# Altium footprint library CMR_ICs.PcbLib: 68 footprints (part 2 of 5)
Each footprint in its own frame and in the unit in brackets; x right, y up, seen from the top. Pads: shape width x height; smd on the part's side, far side on the other; paste and mask are expansions set on the pad; w line width, h text height; cw(c..) or ccw(c..) is an arc to the next point about the centre after c.
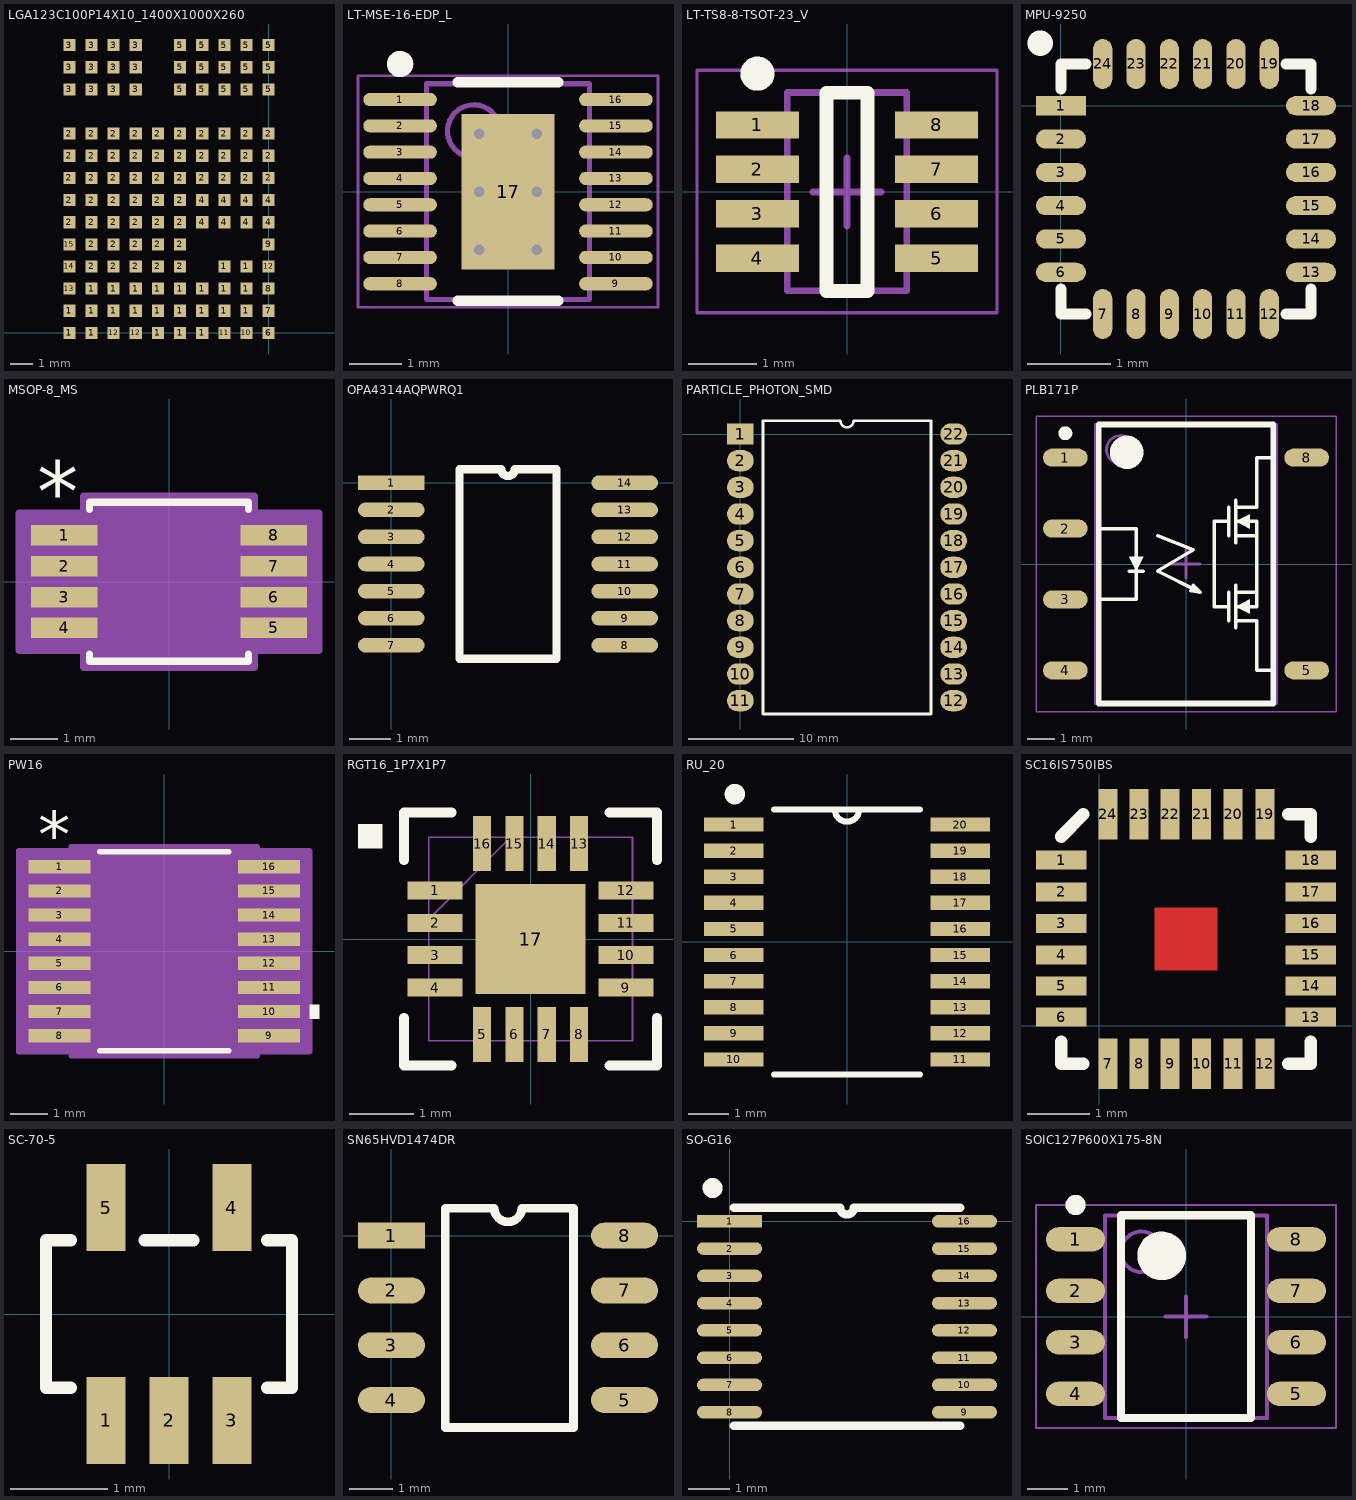
[diagram p1: the footprints below, top view; thin cyan lines are the x and y axes]

## LGA123C100P14X10_1400X1000X260 [mm] "LGA, 123-Leads, Body 14.00x10.00mmx2.60mm, Pitch 1.00mm"
height 2.6
pads (123):
  rect 0.55x0.55 smd: 1(-9,0) 1(-9,1) 1(-8,0) 1(-8,1) 1(-8,2) 1(-7,1) 1(-7,2) 1(-6,1) 1(-6,2) 1(-5,0) 1(-5,1) 1(-5,2) 1(-4,0) 1(-4,1) 1(-4,2) 1(-3,0) 1(-3,1) 1(-3,2) 1(-2,1) 1(-2,2) 1(-2,3) 1(-1,1) 1(-1,2) 1(-1,3) 2(-9,5) 2(-9,6) 2(-9,7) 2(-9,8) 2(-9,9) 2(-8,3) 2(-8,4) 2(-8,5) 2(-8,6) 2(-8,7) 2(-8,8) 2(-8,9) 2(-7,3) 2(-7,4) 2(-7,5) 2(-7,6) 2(-7,7) 2(-7,8) 2(-7,9) 2(-6,3) 2(-6,4) 2(-6,5) 2(-6,6) 2(-6,7) 2(-6,8) 2(-6,9) 2(-5,3) 2(-5,4) 2(-5,5) 2(-5,6) 2(-5,7) 2(-5,8) 2(-5,9) 2(-4,3) 2(-4,4) 2(-4,5) 2(-4,6) 2(-4,7) 2(-4,8) 2(-4,9) 2(-3,7) 2(-3,8) 2(-3,9) 2(-2,7) 2(-2,8) 2(-2,9) 2(-1,7) 2(-1,8) 2(-1,9) 2(0,7) 2(0,8) 2(0,9) 3(-9,11) 3(-9,12) 3(-9,13) 3(-8,11) 3(-8,12) 3(-8,13) 3(-7,11) 3(-7,12) 3(-7,13) 3(-6,11) 3(-6,12) 3(-6,13) 4(-3,5) 4(-3,6) 4(-2,5) 4(-2,6) 4(-1,5) 4(-1,6) 4(0,5) 4(0,6) 5(-4,11) 5(-4,12) 5(-4,13) 5(-3,11) 5(-3,12) 5(-3,13) 5(-2,11) 5(-2,12) 5(-2,13) 5(-1,11) 5(-1,12) 5(-1,13) 5(0,11) 5(0,12) 5(0,13) 6(0,0) 7(0,1) 8(0,2) 9(0,4) 10(-1,0) 11(-2,0) 12(-7,0) 12(-6,0) 12(0,3) 13(-9,2) 14(-9,3) 15(-9,4)
3D body: height 2.6, standoff 0.3, extent -9.5,-0.5 0.5,13.5

## LT-MSE-16-EDP_L [mm] "SOP, 16-Leads, Body 4.1x3.1mm, Pitch 0.5mm, Thermal Pad 2.95x1.76mm, IPC High Density"
height 1.1
pads (17):
  oval 1.4x0.25 smd: 1(-2.05,1.75) 2(-2.05,1.25) 3(-2.05,0.75) 4(-2.05,0.25) 5(-2.05,-0.25) 6(-2.05,-0.75) 7(-2.05,-1.25) 8(-2.05,-1.75) 9(2.05,-1.75) 10(2.05,-1.25) 11(2.05,-0.75) 12(2.05,-0.25) 13(2.05,0.25) 14(2.05,0.75) 15(2.05,1.25) 16(2.05,1.75)
  rect 1.76x2.95 smd: 17(0,0)
via -0.55,1.1 diameter 0.5 hole 0.2
via 0.55,1.1 diameter 0.5 hole 0.2
via -0.55,0 diameter 0.5 hole 0.2
via 0.55,0 diameter 0.5 hole 0.2
via -0.55,-1.1 diameter 0.5 hole 0.2
via 0.55,-1.1 diameter 0.5 hole 0.2
Top Overlay:
  circle w0.25: c-2.05,2.425 r0.125
  lines w0.2: -0.951,-2.075 0.951,-2.075 ; -0.951,2.075 0.951,2.075
Mechanical 13:
  circle w0.1: c-0.65,1.15 r0.5
  lines w0.1: -1.55,-2.05 -1.55,2.05 1.55,2.05 1.55,-2.05 -1.55,-2.05
Mechanical 15:
  lines w0.05: -2.85,-2.2 -2.85,2.2 2.85,2.2 2.85,-2.2 -2.85,-2.2
  lines w0.1: -0.5,0 0.5,0 ; 0,-0.5 0,0.5
3D body: height 1.1, standoff 0.05, extent -1.55,-2.05 1.55,2.05

## LT-TS8-8-TSOT-23_V [mm] "SOT23, 8-Leads, Body 2.90x1.63mm, Pitch 0.65mm, Recommended"
height 1
pads (8):
  rect 1.22x0.4 smd: 1(-1.31,0.975) 2(-1.31,0.325) 3(-1.31,-0.325) 4(-1.31,-0.975) 5(1.31,-0.975) 6(1.31,-0.325) 7(1.31,0.325) 8(1.31,0.975)
Top Overlay:
  circle w0.25: c-1.31,1.726 r0.125
  lines w0.2: -0.3,-1.454 -0.3,1.446 0.3,1.446 0.3,-1.454 -0.3,-1.454
Mechanical 13:
  lines w0.1: -0.875,-1.45 0.875,-1.45 0.875,1.45 -0.875,1.45 -0.875,-1.45
Mechanical 15:
  lines w0.05: -2.195,-1.775 -1.75,-1.775 1.75,-1.775 2.195,-1.775 2.195,-1.55 2.195,1.55 2.195,1.775 1.75,1.775 -1.75,1.775 -2.195,1.775 -2.195,1.55 -2.195,-1.55 -2.195,-1.775
  lines w0.1: -0.501,-0.004 0.499,-0.004 ; -0.001,-0.504 -0.001,0.496
3D body: height 1, standoff 0.01, extent -0.875,-1.45 0.875,1.45

## MPU-9250 [mm] "InvenSense MPU-9250 9-axis IMU"
height 1
pads (24):
  rect 0.6x0.23 smd: 1(0,0)
  rrect100% 0.6x0.23 smd: 2(0,-0.4) 3(0,-0.8) 4(0,-1.2) 5(0,-1.6) 6(0,-2) 13(3,-2) 14(3,-1.6) 15(3,-1.2) 16(3,-0.8) 17(3,-0.4) 18(3,0)
  rrect100% 0.23x0.6 smd: 7(0.5,-2.5) 8(0.9,-2.5) 9(1.3,-2.5) 10(1.7,-2.5) 11(2.1,-2.5) 12(2.5,-2.5) 19(2.5,0.5) 20(2.1,0.5) 21(1.7,0.5) 22(1.3,0.5) 23(0.9,0.5) 24(0.5,0.5)
Top Overlay:
  circle w0.254: c-0.25,0.75 r0.025
  lines w0.127: 0,-2.2 0,-2.5 0.3,-2.5 ; 0,0.2 0,0.5 0.3,0.5 ; 2.7,-2.5 3,-2.5 3,-2.2 ; 2.7,0.5 3,0.5 3,0.2
3D body: height 1, standoff 0, extent 0,-2.5 3,0.5

## MSOP-8_MS [mil]
pads (8):
  rect 55x17 smd paste+0 mask+0: 1(-87,38.39) 2(-87,12.8) 3(-87,-12.8) 4(-87,-38.39) 5(87,-38.39) 6(87,-12.8) 7(87,12.8) 8(87,38.39)
Top Overlay:
  lines w6: -66,-59.99 -66,-66 66,-66 66,-59.99 ; -66,59.99 -66,66 66,66 66,59.99
  text "*" at -109.5,50.39 h50
Mechanical 13:
  lines w0: -12,61 ccw(c0,61) 12,61
  lines w1: -100.5,-45.89 -61,-45.89 -61,-30.89 -100.5,-30.89 -100.5,-45.89 ; -100.5,-20.3 -61,-20.3 -61,-5.3 -100.5,-5.3 -100.5,-20.3 ; -100.5,5.3 -61,5.3 -61,20.3 -100.5,20.3 -100.5,5.3 ; -100.5,30.89 -61,30.89 -61,45.89 -100.5,45.89 -100.5,30.89 ; -61,-61 -61,61 61,61 61,-61 -61,-61 ; 61,-45.89 100.5,-45.89 100.5,-30.89 61,-30.89 61,-45.89 ; 61,-20.3 100.5,-20.3 100.5,-5.3 61,-5.3 61,-20.3 ; 61,5.3 100.5,5.3 100.5,20.3 61,20.3 61,5.3 ; 61,30.89 100.5,30.89 100.5,45.89 61,45.89 61,30.89
  text "*" at -58.5,8 h50
Mechanical 15:
  region: -71,-56.89 -124.5,-56.89 -124.5,56.89 -71,56.89 -71,71 71,71 71,56.89 124.5,56.89 124.5,-56.89 71,-56.89 71,-71 -71,-71
  lines w6: -124.5,-56.89 -71,-56.89 -71,-71 71,-71 71,-56.89 124.5,-56.89 124.5,56.89 71,56.89 71,71 -71,71 -71,56.89 -124.5,56.89 -124.5,-56.89
3D body: height 10, standoff 0, extent 0,0 10,10
3D body "MSOP-8_MS.stp": height 43.11, standoff 0, extent -100.51,-60.98 100.52,60.99
3D body: height 10, standoff 0, extent -157.5,45 -157.5,45

## OPA4314AQPWRQ1 [mm]
pads (14):
  rect 1.6x0.35 smd: 1(0,0)
  oval 1.6x0.35 smd: 2(0,-0.65) 3(0,-1.3) 4(0,-1.95) 5(0,-2.6) 6(0,-3.25) 7(0,-3.9) 8(5.6,-3.9) 9(5.6,-3.25) 10(5.6,-2.6) 11(5.6,-1.95) 12(5.6,-1.3) 13(5.6,-0.65) 14(5.6,0)
Top Overlay:
  lines w0.2: 1.635,-4.225 1.635,0.325 2.638,0.325 ccw(c2.8,0.325) 2.962,0.325 3.965,0.325 3.965,-4.225 1.635,-4.225
3D body: height 1.2, standoff 0, extent 1.27,-4.255 4.318,0.254

## PARTICLE_PHOTON_SMD [mil]
pads (22):
  rect 100x80 smd: 1(0,0)
  oval 100x80 smd: 2(0,-100) 3(0,-200) 4(0,-300) 5(0,-400) 6(0,-500) 7(0,-600) 8(0,-700) 9(0,-800) 10(0,-900) 11(0,-1000) 12(800,-1000) 13(800,-900) 14(800,-800) 15(800,-700) 16(800,-600) 17(800,-500) 18(800,-400) 19(800,-300) 20(800,-200) 21(800,-100) 22(800,0)
Top Overlay:
  lines w10: 85,-1050 715,-1050 715,50 425,50 cw(c400,50) 375,50 85,50 85,-1050

## PLB171P [mm] "SOP, 8-Leads, Body 9.65x6.35mm, Pitch 2.54mm, IPC Medium Density"
height 2.29
pads (6):
  oval 1.6x0.65 smd: 1(-4.325,3.81) 2(-4.325,1.27) 3(-4.325,-1.27) 4(-4.325,-3.81) 5(4.325,-3.81) 8(4.325,3.81)
Top Overlay:
  circle w0.25: c-4.325,4.685 r0.125
  circle w0.6: c-2.125,4 r0.3
  region: -1.778,-0.254 -1.524,0.254 -2.032,0.254
  region: 1.778,-1.524 2.286,-1.778 2.286,-1.27
  region: 1.778,1.524 2.286,1.27 2.286,1.778
  lines w0.127: -3.125,-1.27 -1.778,-1.27 -1.778,1.27 -3.125,1.27 ; -2.032,-0.254 -1.524,-0.254 ; -1.016,1.016 0.254,0.508 -1.016,-0.254 0.508,-1.016 ; 0.178,-0.965 0.508,-1.016 ; 0.254,-0.762 0.508,-1.016 ; 1.524,-2.032 1.524,-1.016 ; 1.524,-1.524 1.016,-1.524 1.016,1.524 1.524,1.524 ; 1.524,1.016 1.524,2.032 ; 1.778,-2.286 1.778,-0.762 ; 1.778,-2.032 2.54,-2.032 2.54,-3.81 3.125,-3.81 ; 1.778,-1.524 2.54,-1.524 2.54,1.524 1.778,1.524 ; 1.778,-1.016 2.54,-1.016 ; 1.778,0.762 1.778,2.286 ; 1.778,1.016 2.54,1.016 ; 1.778,2.032 2.54,2.032 2.54,3.81 3.125,3.81
  lines w0.2: -3.125,-5 -3.125,5 3.125,5 3.125,-5 -3.125,-5
Mechanical 13:
  circle w0.1: c-2.35,4.1 r0.5
  lines w0.1: -3.25,-5 -3.25,5 3.25,5 3.25,-5 -3.25,-5
Mechanical 15:
  lines w0.05: -5.375,-5.3 -5.375,5.3 5.375,5.3 5.375,-5.3 -5.375,-5.3
  lines w0.1: -0.5,0 0.5,0 ; 0,-0.5 0,0.5
3D body "SOP254P940X229-8N.step": height 2.29, standoff 0, extent -4.699,-5 4.699,5

## PW16 [mil]
pads (16):
  rect 66x14 smd paste+0 mask+0: 1(-111,89.57) 2(-111,63.98) 3(-111,38.39) 4(-111,12.8) 5(-111,-12.8) 6(-111,-38.39) 7(-111,-63.98) 8(-111,-89.57) 9(111,-89.57) 10(111,-63.98) 11(111,-38.39) 12(111,-12.8) 13(111,12.8) 14(111,38.39) 15(111,63.98) 16(111,89.57)
Top Overlay:
  region: 154,-56.48 164,-56.48 164,-71.48 154,-71.48
  lines w6: -68.42,-105.5 68.42,-105.5 ; -68.42,105.5 68.42,105.5
  text "*" at -133.5,98.57 h50
Mechanical 13:
  lines w0: -12,100.5 ccw(c0,100.5) 12,100.5
  lines w1: -130,-95.57 -88.5,-95.57 -88.5,-83.57 -130,-83.57 -130,-95.57 ; -130,-69.98 -88.5,-69.98 -88.5,-57.98 -130,-57.98 -130,-69.98 ; -130,-44.39 -88.5,-44.39 -88.5,-32.39 -130,-32.39 -130,-44.39 ; -130,-18.8 -88.5,-18.8 -88.5,-6.8 -130,-6.8 -130,-18.8 ; -130,6.8 -88.5,6.8 -88.5,18.8 -130,18.8 -130,6.8 ; -130,32.39 -88.5,32.39 -88.5,44.39 -130,44.39 -130,32.39 ; -130,57.98 -88.5,57.98 -88.5,69.98 -130,69.98 -130,57.98 ; -130,83.57 -88.5,83.57 -88.5,95.57 -130,95.57 -130,83.57 ; -88.5,-100.5 -88.5,100.5 88.5,100.5 88.5,-100.5 -88.5,-100.5 ; 88.5,-95.57 130,-95.57 130,-83.57 88.5,-83.57 88.5,-95.57 ; 88.5,-69.98 130,-69.98 130,-57.98 88.5,-57.98 88.5,-69.98 ; 88.5,-44.39 130,-44.39 130,-32.39 88.5,-32.39 88.5,-44.39 ; 88.5,-18.8 130,-18.8 130,-6.8 88.5,-6.8 88.5,-18.8 ; 88.5,6.8 130,6.8 130,18.8 88.5,18.8 88.5,6.8 ; 88.5,32.39 130,32.39 130,44.39 88.5,44.39 88.5,32.39 ; 88.5,57.98 130,57.98 130,69.98 88.5,69.98 88.5,57.98 ; 88.5,83.57 130,83.57 130,95.57 88.5,95.57 88.5,83.57
  text "*" at -86,47.5 h50
Mechanical 15:
  region: -98.5,-106.57 -154,-106.57 -154,106.57 -98.5,106.57 -98.5,110.5 98.5,110.5 98.5,106.57 154,106.57 154,-106.57 98.5,-106.57 98.5,-110.5 -98.5,-110.5
  lines w6: -154,-106.57 -98.5,-106.57 -98.5,-110.5 98.5,-110.5 98.5,-106.57 154,-106.57 154,106.57 98.5,106.57 98.5,110.5 -98.5,110.5 -98.5,106.57 -154,106.57 -154,-106.57
3D body: height 10, standoff 0, extent 0,0 10,10

## RGT16_1P7X1P7 [mm]
pads (17):
  rect 0.85x0.28 smd paste-0.14 mask+0: 1(-1.475,0.75) 2(-1.475,0.25) 3(-1.475,-0.25) 4(-1.475,-0.75) 9(1.475,-0.75) 10(1.475,-0.25) 11(1.475,0.25) 12(1.475,0.75)
  rect 0.28x0.85 smd paste-0.14 mask+0: 5(-0.75,-1.475) 6(-0.25,-1.475) 7(0.25,-1.475) 8(0.75,-1.475) 13(0.75,1.475) 14(0.25,1.475) 15(-0.25,1.475) 16(-0.75,1.475)
  rect 1.7x1.7 smd paste-0.837 mask-0.838: 17(0,0)
Top Overlay:
  rectangle: -2.667,1.397 -2.286,1.778
  lines w0.152: -1.956,-1.218 -1.956,-1.956 -1.218,-1.956 ; -1.956,1.218 -1.956,1.956 -1.218,1.956 ; 1.218,-1.956 1.956,-1.956 1.956,-1.218 ; 1.218,1.956 1.956,1.956 1.956,1.218
Top Paste:
  region: 0.775,-0.494 0.635,-0.494 0.494,-0.635 0.494,-0.775 0.775,-0.775
  region: 0.775,0.294 0.635,0.294 0.494,0.152 0.494,-0.152 0.635,-0.294 0.775,-0.294
  region: 0.775,0.775 0.494,0.775 0.494,0.635 0.635,0.494 0.775,0.494
  region: 0.152,-0.494 -0.152,-0.494 -0.294,-0.635 -0.294,-0.775 0.294,-0.775 0.294,-0.635
  region: 0.152,0.294 -0.152,0.294 -0.294,0.152 -0.294,-0.152 -0.152,-0.294 0.152,-0.294 0.294,-0.152 0.294,0.152
  region: 0.294,0.775 -0.294,0.775 -0.294,0.635 -0.152,0.494 0.152,0.494 0.294,0.635
  region: -0.635,-0.494 -0.775,-0.494 -0.775,-0.775 -0.494,-0.775 -0.494,-0.635
  region: -0.635,0.294 -0.775,0.294 -0.775,-0.294 -0.635,-0.294 -0.494,-0.152 -0.494,0.152
  region: -0.494,0.775 -0.775,0.775 -0.775,0.494 -0.635,0.494 -0.494,0.635
  region: -0.635,1.875 -0.865,1.875 -0.865,1.075 -0.635,1.075
  region: -0.135,1.875 -0.365,1.875 -0.365,1.075 -0.135,1.075
  region: 0.365,1.875 0.135,1.875 0.135,1.075 0.365,1.075
  region: 0.865,1.875 0.635,1.875 0.635,1.075 0.865,1.075
  region: 1.875,0.865 1.075,0.865 1.075,0.635 1.875,0.635
  region: 1.875,0.365 1.075,0.365 1.075,0.135 1.875,0.135
  region: 1.875,-0.135 1.075,-0.135 1.075,-0.365 1.875,-0.365
  region: 1.875,-0.635 1.075,-0.635 1.075,-0.865 1.875,-0.865
  region: 0.865,-1.075 0.635,-1.075 0.635,-1.875 0.865,-1.875
  region: 0.365,-1.075 0.135,-1.075 0.135,-1.875 0.365,-1.875
  region: -0.135,-1.075 -0.365,-1.075 -0.365,-1.875 -0.135,-1.875
  region: -0.635,-1.075 -0.865,-1.075 -0.865,-1.875 -0.635,-1.875
  region: -1.075,-0.635 -1.875,-0.635 -1.875,-0.865 -1.075,-0.865
  region: -1.075,-0.135 -1.875,-0.135 -1.875,-0.365 -1.075,-0.365
  region: -1.075,0.365 -1.875,0.365 -1.875,0.135 -1.075,0.135
  region: -1.075,0.865 -1.875,0.865 -1.875,0.635 -1.075,0.635
Top Solder:
  region: 0.594,-0.914 0.594,0.914 0.914,0.914 0.914,-0.914
  region: 0.194,-0.914 0.194,0.914 -0.194,0.914 -0.194,-0.914
  region: -0.914,-0.914 -0.914,0.914 -0.594,0.914 -0.594,-0.914
  region: -0.914,-0.914 -0.914,-0.594 0.914,-0.594 0.914,-0.914
  region: -0.914,-0.194 -0.914,0.194 0.914,0.194 0.914,-0.194
  region: -0.914,0.594 -0.914,0.914 0.914,0.914 0.914,0.594
  region: -0.541,1.97 -0.96,1.97 -0.96,0.98 -0.541,0.98
  region: -0.04,1.97 -0.46,1.97 -0.46,0.98 -0.04,0.98
  region: 0.46,1.97 0.04,1.97 0.04,0.98 0.46,0.98
  region: 0.96,1.97 0.541,1.97 0.541,0.98 0.96,0.98
  region: 1.97,0.96 0.98,0.96 0.98,0.54 1.97,0.54
  region: 1.97,0.46 0.98,0.46 0.98,0.04 1.97,0.04
  region: 1.97,-0.04 0.98,-0.04 0.98,-0.46 1.97,-0.46
  region: 1.97,-0.54 0.98,-0.54 0.98,-0.96 1.97,-0.96
  region: 0.96,-0.98 0.541,-0.98 0.541,-1.97 0.96,-1.97
  region: 0.46,-0.98 0.04,-0.98 0.04,-1.97 0.46,-1.97
  region: -0.04,-0.98 -0.46,-0.98 -0.46,-1.97 -0.04,-1.97
  region: -0.541,-0.98 -0.96,-0.98 -0.96,-1.97 -0.541,-1.97
  region: -0.98,-0.54 -1.97,-0.54 -1.97,-0.96 -0.98,-0.96
  region: -0.98,-0.04 -1.97,-0.04 -1.97,-0.46 -0.98,-0.46
  region: -0.98,0.46 -1.97,0.46 -1.97,0.04 -0.98,0.04
  region: -0.98,0.96 -1.97,0.96 -1.97,0.54 -0.98,0.54
Mechanical 13:
  lines w0.025: -1.575,0.305 -0.305,1.575 ; -1.575,-1.575 -1.575,1.575 1.575,1.575 1.575,-1.575 -1.575,-1.575
Mechanical 16:
  circle w0.127: c0.394,0.394 r0.191
  circle w0.127: c0.394,-0.394 r0.191
  circle w0.127: c-0.394,0.394 r0.191
  circle w0.127: c-0.394,-0.394 r0.191
3D body: height 0.25, standoff 0, extent 0,0 0.254,0.254

## RU_20 [mil]
pads (20):
  rect 58x14 smd: 1(-111,115.16) 2(-111,89.57) 3(-111,63.98) 4(-111,38.39) 5(-111,12.8) 6(-111,-12.8) 7(-111,-38.39) 8(-111,-63.98) 9(-111,-89.57) 10(-111,-115.16) 11(111,-115.16) 12(111,-89.57) 13(111,-63.98) 14(111,-38.39) 15(111,-12.8) 16(111,12.8) 17(111,38.39) 18(111,63.98) 19(111,89.57) 20(111,115.16)
Top Overlay:
  circle w10: c-110,145 r5
  lines w6: -71.63,-130 71.63,-130 ; -71.63,130 71.63,130 ; -12,130 ccw(c0,130) 12,130
3D body: height 10, standoff 0, extent -88.58,-129.92 -88.58,-129.92
3D body: height 47.24, standoff 3.94, extent -88.58,-129.92 88.58,129.92

## SC16IS750IBS [mil] "SPI->UART"
pads (24):
  rect 32x12 smd: 1(-24,104.74) 2(-24,84.74) 3(-24,64.74) 4(-24,44.9) 5(-24,25.21) 6(-24,5.53) 13(133.74,5.53) 14(133.74,25.21) 15(133.74,44.9) 16(133.74,64.74) 17(133.74,84.74) 18(133.74,104.74)
  rect 12x32 smd: 7(5.53,-24) 8(25.21,-24) 9(44.9,-24) 10(64.74,-24) 11(84.74,-24) 12(104.74,-24) 19(104.74,133.74) 20(84.74,133.74) 21(64.74,133.74) 22(44.9,133.74) 23(25.21,133.74) 24(5.53,133.74)
Top Layer:
  rectangle: 35.06,35.06 74.74,74.74
Top Overlay:
  lines w8: -24,-10.22 -24,-24 -10.22,-24 ; -24,119.74 -10.22,133.74 ; 119.74,-24 133.74,-24 133.74,-10.22 ; 119.74,133.74 133.74,133.74 133.74,119.74
Top Paste:
  rectangle: 42.93,42.93 66.74,66.74
Top Solder:
  rectangle: 35.06,35.06 74.74,74.74
Mechanical 2:
Mechanical 4:
3D body "User Library-QFN24-0_5.STEP": height 39.37, standoff 0, extent -23.61,-23.61 133.86,133.87

## SC-70-5 [mm] "Used for 2 input and gate"
pads (5):
  rect 0.4x0.9 smd paste+0: 1(-0.65,-1.1) 2(0,-1.1) 3(0.65,-1.1) 4(0.65,1.1) 5(-0.65,1.1)
Top Overlay:
  lines w0.127: -1.016,-0.762 -1.27,-0.762 -1.27,0.762 -1.016,0.762 ; -0.254,0.762 0.254,0.762 ; 1.016,-0.762 1.27,-0.762 1.27,0.762 1.016,0.762
3D body "User Library-TSSOP-5 (SOT-23-5 PITCH 0_65).STEP": height 1.1, standoff -0.01, extent -1.125,-1.125 1.125,1.125

## SN65HVD1474DR [mm]
pads (8):
  rect 1.55x0.6 smd: 1(0,0)
  oval 1.55x0.6 smd: 2(0,-1.27) 3(0,-2.54) 4(0,-3.81) 5(5.4,-3.81) 6(5.4,-2.54) 7(5.4,-1.27) 8(5.4,0)
Top Overlay:
  lines w0.2: 1.245,-4.445 4.216,-4.445 4.216,0.635 3.017,0.635 cw(c2.7,0.635) 2.382,0.635 1.245,0.635 1.245,-4.445
3D body: height 1.75, standoff 0, extent 1.143,-4.191 4.318,0.381
3D body: height 10.15, standoff -4.59, extent 0.889,0.508 0.889,0.508

## SO-G16 [mm]
pads (16):
  rect 1.55x0.3 smd: 1(0,0)
  oval 1.55x0.3 smd: 2(0,-0.65) 3(0,-1.3) 4(0,-1.95) 5(0,-2.6) 6(0,-3.25) 7(0,-3.9) 8(0,-4.55) 9(5.6,-4.55) 10(5.6,-3.9) 11(5.6,-3.25) 12(5.6,-2.6) 13(5.6,-1.95) 14(5.6,-1.3) 15(5.6,-0.65) 16(5.6,0)
Top Overlay:
  lines w0.2: 0.1,-4.875 5.5,-4.875 ; 0.1,0.325 2.638,0.325 ccw(c2.8,0.325) 2.962,0.325 5.5,0.325
  lines w0.254: -0.325,0.875 ccw(c-0.403,0.795) -0.301,0.842
3D body: height 1.2, standoff 0.1, extent 0,-4.9 5.6,0.3

## SOIC127P600X175-8N [mm] "SOIC, 8-Leads, Body 4.90x3.90mm, Pitch 1.27mm, IPC Medium Density"
height 1.75
pads (8):
  oval 1.45x0.6 smd: 1(-2.725,1.905) 2(-2.725,0.635) 3(-2.725,-0.635) 4(-2.725,-1.905) 5(2.725,-1.905) 6(2.725,-0.635) 7(2.725,0.635) 8(2.725,1.905)
Top Overlay:
  circle w0.6: c-0.6,1.5 r0.3
  circle w0.25: c-2.725,2.755 r0.125
  lines w0.2: -1.6,-2.5 1.6,-2.5 1.6,2.5 -1.6,2.5 -1.6,-2.5
Mechanical 13:
  circle w0.1: c-1.1,1.6 r0.5
  lines w0.1: -2,-2.5 2,-2.5 2,2.5 -2,2.5 -2,-2.5
Mechanical 15:
  lines w0.05: -3.7,-2.75 3.7,-2.75 3.7,2.75 -3.7,2.75 -3.7,-2.75
  lines w0.1: -0.5,0 0.5,0 ; 0,-0.5 0,0.5
3D body: height 1.75, standoff 0.1, extent -2,-2.5 2,2.5